# Altium footprint library miniVent_PCB_v1_0.PcbLib: 31 footprints (part 2 of 2)
Each footprint in its own frame and in the unit in brackets; x right, y up, seen from the top. Pads: shape width x height; smd on the part's side, far side on the other; paste and mask are expansions set on the pad; w line width, h text height; cw(c..) or ccw(c..) is an arc to the next point about the centre after c.
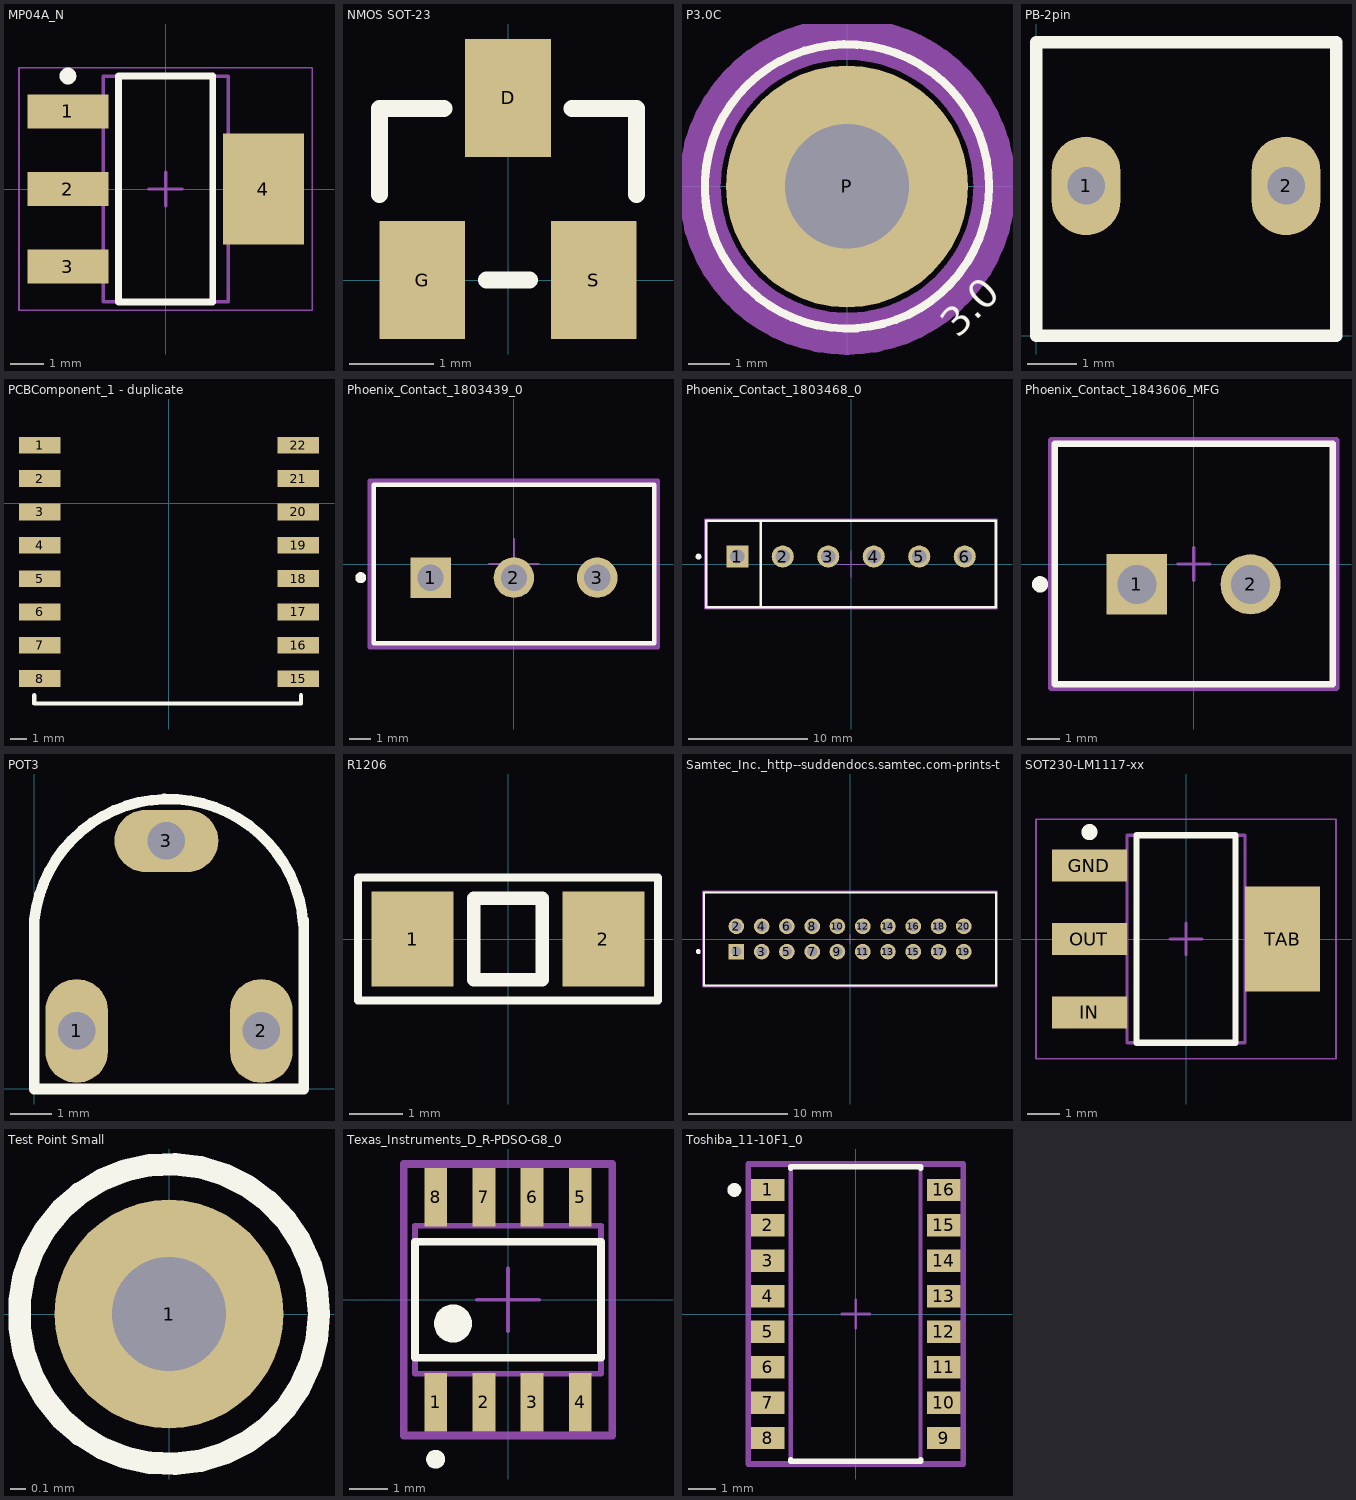
[diagram p1: the footprints below, top view; thin cyan lines are the x and y axes]

## MP04A_N [mm] "SOT223, 4-Leads, Body 6.5x3.5mm, Pitch 2.3mm, Lead Span 7mm, IPC Medium Density"
height 1.8
pads (4):
  rect 2.4x1 smd: 1(-2.9,2.3) 2(-2.9,0) 3(-2.9,-2.3)
  rect 2.4x3.3 smd: 4(2.9,0)
Top Overlay:
  circle w0.25: c-2.9,3.35 r0.125
  lines w0.2: -1.4,-3.35 1.4,-3.35 1.4,3.35 -1.4,3.35 -1.4,-3.35
Mechanical 13:
  lines w0.1: -1.855,-3.35 1.855,-3.35 1.855,3.35 -1.855,3.35 -1.855,-3.35
Mechanical 15:
  lines w0.05: -4.35,-3.6 4.35,-3.6 4.35,3.6 -4.35,3.6 -4.35,-3.6
  lines w0.1: -0.5,0 0.5,0 ; 0,-0.5 0,0.5
3D body: height 1.8, standoff 0.03, extent -1.855,-3.35 1.855,3.35

## NMOS SOT-23 [mil]
pads (3):
  rect 40x55 smd: D(0,85) G(-40,0) S(40,0)
Top Overlay:
  lines w8: -60,40 -60,80 -30,80 ; -10,0 10,0 ; 30,80 60,80 60,40

## P3.0C [mil]
pads (1):
  round 230 hole 118.11: P(0,0)
Top Overlay:
  circle w7.87: c0,0 r62.99
  circle w7.87: c0,0 r135
  text "3.0" at 105,-145 h27.56
Bottom Overlay:
  circle w7.87: c0,0 r135
  circle w7.87: c0,0 r62.99
Mechanical 1:
  circle w40: c0,0 r140

## PB-2pin [mil] "Switch"
height 236.22
pads (2):
  oval 55.12x78.74 hole 30: 1(40,120) 2(200,120)
Top Overlay:
  lines w10: 0,0 240,0 240,235 0,235 0,0

## PCBComponent_1 - duplicate [mm]
height 1.75
pads (16):
  rect 2.5x1 smd: 1(-7.75,3.493) 2(-7.75,1.493) 3(-7.75,-0.507) 4(-7.75,-2.507) 5(-7.75,-4.507) 6(-7.75,-6.507) 7(-7.75,-8.507) 8(-7.75,-10.507) 15(7.75,-10.507) 16(7.75,-8.507) 17(7.75,-6.507) 18(7.75,-4.507) 19(7.75,-2.507) 20(7.75,-0.507) 21(7.75,1.493) 22(7.75,3.493)
Top Overlay:
  lines w0.254: -8.084,-11.507 -8.084,-12.007 7.916,-12.007 7.916,-11.507
3D body "ESP-12F.step": height 2.9, standoff -0.05, extent -8.042,-12.003 7.958,11.997

## Phoenix_Contact_1803439_0 [mm]
pads (3):
  rect 1.85x1.85 hole 1.2 paste-1000 mask+0: 1(-3.81,-0.625)
  round 1.85 hole 1.2 paste-1000 mask+0: 2(0,-0.625) 3(3.81,-0.625)
Top Overlay:
  circle w0.25: c-7,-0.625 r0.125
  lines w0.2: -6.41,-3.625 6.41,-3.625 6.41,3.625 -6.41,3.625 -6.41,-3.625
Mechanical 10:
  lines w0.2: -6.585,-3.8 6.585,-3.8 6.585,3.8 -6.585,3.8 -6.585,-3.8
  text ".Designator" at 0,0 h1
Mechanical 12:
  lines w0.15: -6.41,-3.625 6.41,-3.625 6.41,3.625 -6.41,3.625 -6.41,-3.625
Mechanical 15:
  lines w0.1: -1.14,0 1.14,0 ; 0,-1.14 0,1.14
  lines w0.2: -6.585,-3.8 6.585,-3.8 6.585,3.8 -6.585,3.8 -6.585,-3.8
3D body "1860650.stp": height 9.2, standoff -3.8, extent -6.283,-3.429 6.537,3.821

## Phoenix_Contact_1803468_0 [mm]
pads (6):
  rect 1.85x1.85 hole 1.2 paste-1000 mask+0: 1(-9.525,0.625)
  round 1.85 hole 1.2 paste-1000 mask+0: 2(-5.715,0.625) 3(-1.905,0.625) 4(1.905,0.625) 5(5.715,0.625) 6(9.525,0.625)
Top Overlay:
  circle w0.25: c-12.775,0.625 r0.125
  lines w0.2: -7.575,-3.625 -7.575,3.625 ; -12.125,-3.625 -12.125,3.625 12.125,3.625 12.125,-3.625 -12.125,-3.625
Mechanical 10:
  lines w0.2: -12.225,-3.725 -12.225,3.725 12.225,3.725 12.225,-3.725 -12.225,-3.725
  text ".Designator" at 0,0 h1
Mechanical 12:
  lines w0.15: -12.125,-3.625 -12.125,3.625 12.125,3.625 12.125,-3.625 -12.125,-3.625
Mechanical 15:
  lines w0.1: -1.118,0 1.118,0 ; 0,-1.118 0,1.118
  lines w0.2: -12.225,-3.725 -12.225,3.725 12.225,3.725 12.225,-3.725 -12.225,-3.725
3D body "1860689.stp": height 9.2, standoff -3.8, extent -12.125,-3.81 12.125,3.44

## Phoenix_Contact_1843606_MFG [mm]
pads (2):
  rect 1.85x1.85 hole 1.2 paste-1000 mask+0: 1(-1.75,-0.625)
  round 1.85 hole 1.2 paste-1000 mask+0: 2(1.75,-0.625)
Top Overlay:
  circle w0.25: c-4.725,-0.625 r0.125
  lines w0.2: -4.275,-3.7 4.275,-3.7 4.275,3.7 -4.275,3.7 -4.275,-3.7
Mechanical 10:
  lines w0.2: -4.375,-3.8 4.375,-3.8 4.375,3.8 -4.375,3.8 -4.375,-3.8
  text ".Designator" at 0,0 h1
Mechanical 12:
  lines w0.15: -4.275,-3.7 4.275,-3.7 4.275,3.7 -4.275,3.7 -4.275,-3.7
Mechanical 15:
  lines w0.1: -0.5,0 0.5,0 ; 0,-0.5 0,0.5
  lines w0.2: -4.375,-3.8 4.375,-3.8 4.375,3.8 -4.375,3.8 -4.375,-3.8
3D body "Conn_Phoenix_Contact_1843606_eec.STEP": height 0.25, standoff 0, extent -4.375,-3.8 4.375,3.8

## POT3 [mm]
pads (3):
  oval 1.5x2.5 hole 0.9: 1(1.016,1.397) 2(5.461,1.397)
  oval 2.5x1.5 hole 0.9: 3(3.175,5.969)
Top Overlay:
  lines w0.254: 6.474,3.961 ccw(c3.233,3.73) 0,4.064 0,0 6.477,0 6.477,4.064

## R1206 [mil]
pads (2):
  rect 60x70 smd: 1(-70,0) 2(70,0)
Top Overlay:
  lines w5.91: -110,-45 110,-45 110,45 -110,45 -110,-45
  lines w10: -25,-30 25,-30 25,30 -25,30 -25,-30
3D body "User Library-R_1206.step": height 23.62, standoff 0, extent -64.17,-31.1 61.81,31.89

## Samtec_Inc._http--suddendocs.samtec.com-prints-tss-tstd.pdf_0 [mm]
pads (20):
  rect 1.57x1.57 hole 1.02 paste-1000 mask+0: 1(-11.43,-1.27)
  round 1.57 hole 1.02 paste-1000 mask+0: 2(-11.43,1.27) 3(-8.89,-1.27) 4(-8.89,1.27) 5(-6.35,-1.27) 6(-6.35,1.27) 7(-3.81,-1.27) 8(-3.81,1.27) 9(-1.27,-1.27) 10(-1.27,1.27) 11(1.27,-1.27) 12(1.27,1.27) 13(3.81,-1.27) 14(3.81,1.27) 15(6.35,-1.27) 16(6.35,1.27) 17(8.89,-1.27) 18(8.89,1.27) 19(11.43,-1.27) 20(11.43,1.27)
Top Overlay:
  circle w0.25: c-15.27,-1.27 r0.125
  lines w0.2: -14.67,-4.7 -14.67,4.7 14.67,4.7 14.67,-4.7 -14.67,-4.7
Mechanical 10:
  lines w0.2: -14.77,-4.8 -14.77,4.8 14.77,4.8 14.77,-4.8 -14.77,-4.8
  text ".Designator" at 0,0 h1
Mechanical 12:
  lines w0.15: -14.67,-4.7 -14.67,4.7 14.67,4.7 14.67,-4.7 -14.67,-4.7
Mechanical 15:
  lines w0.1: -0.5,0 0.5,0 ; 0,-0.5 0,0.5
  lines w0.2: -14.77,-4.8 -14.77,4.8 14.77,4.8 14.77,-4.8 -14.77,-4.8
3D body "Conn_Samtec_Inc._TSS-110-01-G-D_eec.STEP": height 0.25, standoff 0, extent -14.77,-4.8 14.77,4.8

## SOT230-LM1117-xx [mm] "SOT223, 4-Leads, Body 6.50x7.00mm (avg), Pitch 2.30mm, IPC Low Density"
height 1.8
pads (4):
  rect 2.35x1 smd: GND(-3.025,2.3) IN(-3.025,-2.3) OUT(-3.025,0)
  rect 2.35x3.3 smd: TAB(3.025,0)
Top Overlay:
  circle w0.25: c-3.025,3.35 r0.125
  lines w0.2: -1.55,-3.25 1.55,-3.25 1.55,3.25 -1.55,3.25 -1.55,-3.25
Mechanical 13:
  lines w0.1: -1.85,-3.25 1.85,-3.25 1.85,3.25 -1.85,3.25 -1.85,-3.25
Mechanical 15:
  lines w0.05: -4.7,-3.75 4.7,-3.75 4.7,3.75 -4.7,3.75 -4.7,-3.75
  lines w0.1: -0.5,0 0.5,0 ; 0,-0.5 0,0.5
3D body: height 1.8, standoff 0.02, extent -1.85,-3.25 1.85,3.25

## Test Point Small [mil]
pads (1):
  round 60 hole 30: 1(0,0)
Top Overlay:
  circle w5.91: c0,0 r39.37
3D body "SW3DPS-TEST POINT-DEFAULT.step": height 255.91, standoff -118.11, extent -19.68,-19.69 19.69,19.69

## Texas_Instruments_D_R-PDSO-G8_0 [mm]
pads (8):
  rect 0.6x1.55 smd paste-1000 mask+0: 1(-1.905,-2.7) 2(-0.635,-2.7) 3(0.635,-2.7) 4(1.905,-2.7) 5(1.905,2.7) 6(0.635,2.7) 7(-0.635,2.7) 8(-1.905,2.7)
Top Overlay:
  circle w0.5: c-1.45,-0.625 r0.25
  circle w0.25: c-1.905,-4.2 r0.125
  lines w0.2: -2.45,-1.525 2.45,-1.525 2.45,1.525 -2.45,1.525 -2.45,-1.525
Top Paste:
  rectangle: -2.18,1.95 -1.63,3.45
  rectangle: -2.18,-3.45 -1.63,-1.95
  rectangle: 1.63,-3.45 2.18,-1.95
  rectangle: 1.63,1.95 2.18,3.45
  rectangle: 0.36,1.95 0.91,3.45
  rectangle: -0.91,1.95 -0.36,3.45
  rectangle: -0.91,-3.45 -0.36,-1.95
  rectangle: 0.36,-3.45 0.91,-1.95
Mechanical 10:
  lines w0.2: -2.75,-3.575 2.75,-3.575 2.75,3.575 -2.75,3.575 -2.75,-3.575
  text ".Designator" at 0,0 h1
Mechanical 12:
  lines w0.15: -2.45,-1.95 2.45,-1.95 2.45,1.95 -2.45,1.95 -2.45,-1.95
Mechanical 15:
  lines w0.1: -0.825,0 0.825,0 ; -0.5,0 0.5,0 ; 0,-0.825 0,0.825 ; 0,-0.5 0,0.5
  lines w0.2: -2.75,-3.575 2.75,-3.575 2.75,3.575 -2.75,3.575 -2.75,-3.575
3D body "3dmodel.step": height 0.25, standoff 0, extent -2.75,-3.575 2.75,3.575

## Toshiba_11-10F1_0 [mm]
pads (16):
  rect 1.2x0.8 smd paste+0 mask+0: 1(-3.15,4.445) 2(-3.15,3.175) 3(-3.15,1.905) 4(-3.15,0.635) 5(-3.15,-0.635) 6(-3.15,-1.905) 7(-3.15,-3.175) 8(-3.15,-4.445) 9(3.15,-4.445) 10(3.15,-3.175) 11(3.15,-1.905) 12(3.15,-0.635) 13(3.15,0.635) 14(3.15,1.905) 15(3.15,3.175) 16(3.15,4.445)
Top Overlay:
  circle w0.25: c-4.35,4.445 r0.125
  lines w0.2: -2.325,-5.22 -2.325,-5.275 2.325,-5.275 2.325,-5.22 ; -2.325,5.22 -2.325,5.275 2.325,5.275 2.325,5.22
Mechanical 10:
  lines w0.2: -3.85,-5.375 3.85,-5.375 3.85,5.375 -3.85,5.375 -3.85,-5.375
  text ".Designator" at 0,0 h1
Mechanical 12:
  lines w0.15: -2.325,-5.275 2.325,-5.275 2.325,5.275 -2.325,5.275 -2.325,-5.275
Mechanical 15:
  lines w0.1: -0.5,0 0.5,0 ; 0,-0.5 0,0.5
  lines w0.2: -3.85,-5.375 3.85,-5.375 3.85,5.375 -3.85,5.375 -3.85,-5.375
3D body "Trans_Toshiba_TLP281-4_GB-TP,J,F_eec.STEP": height 0.25, standoff 0, extent -3.85,-5.375 3.85,5.375